# Altium footprint library MU_MP_39_V1.PcbLib: 76 footprints (part 4 of 5)
Each footprint in its own frame and in the unit in brackets; x right, y up, seen from the top. Pads: shape width x height; smd on the part's side, far side on the other; paste and mask are expansions set on the pad; w line width, h text height; cw(c..) or ccw(c..) is an arc to the next point about the centre after c.
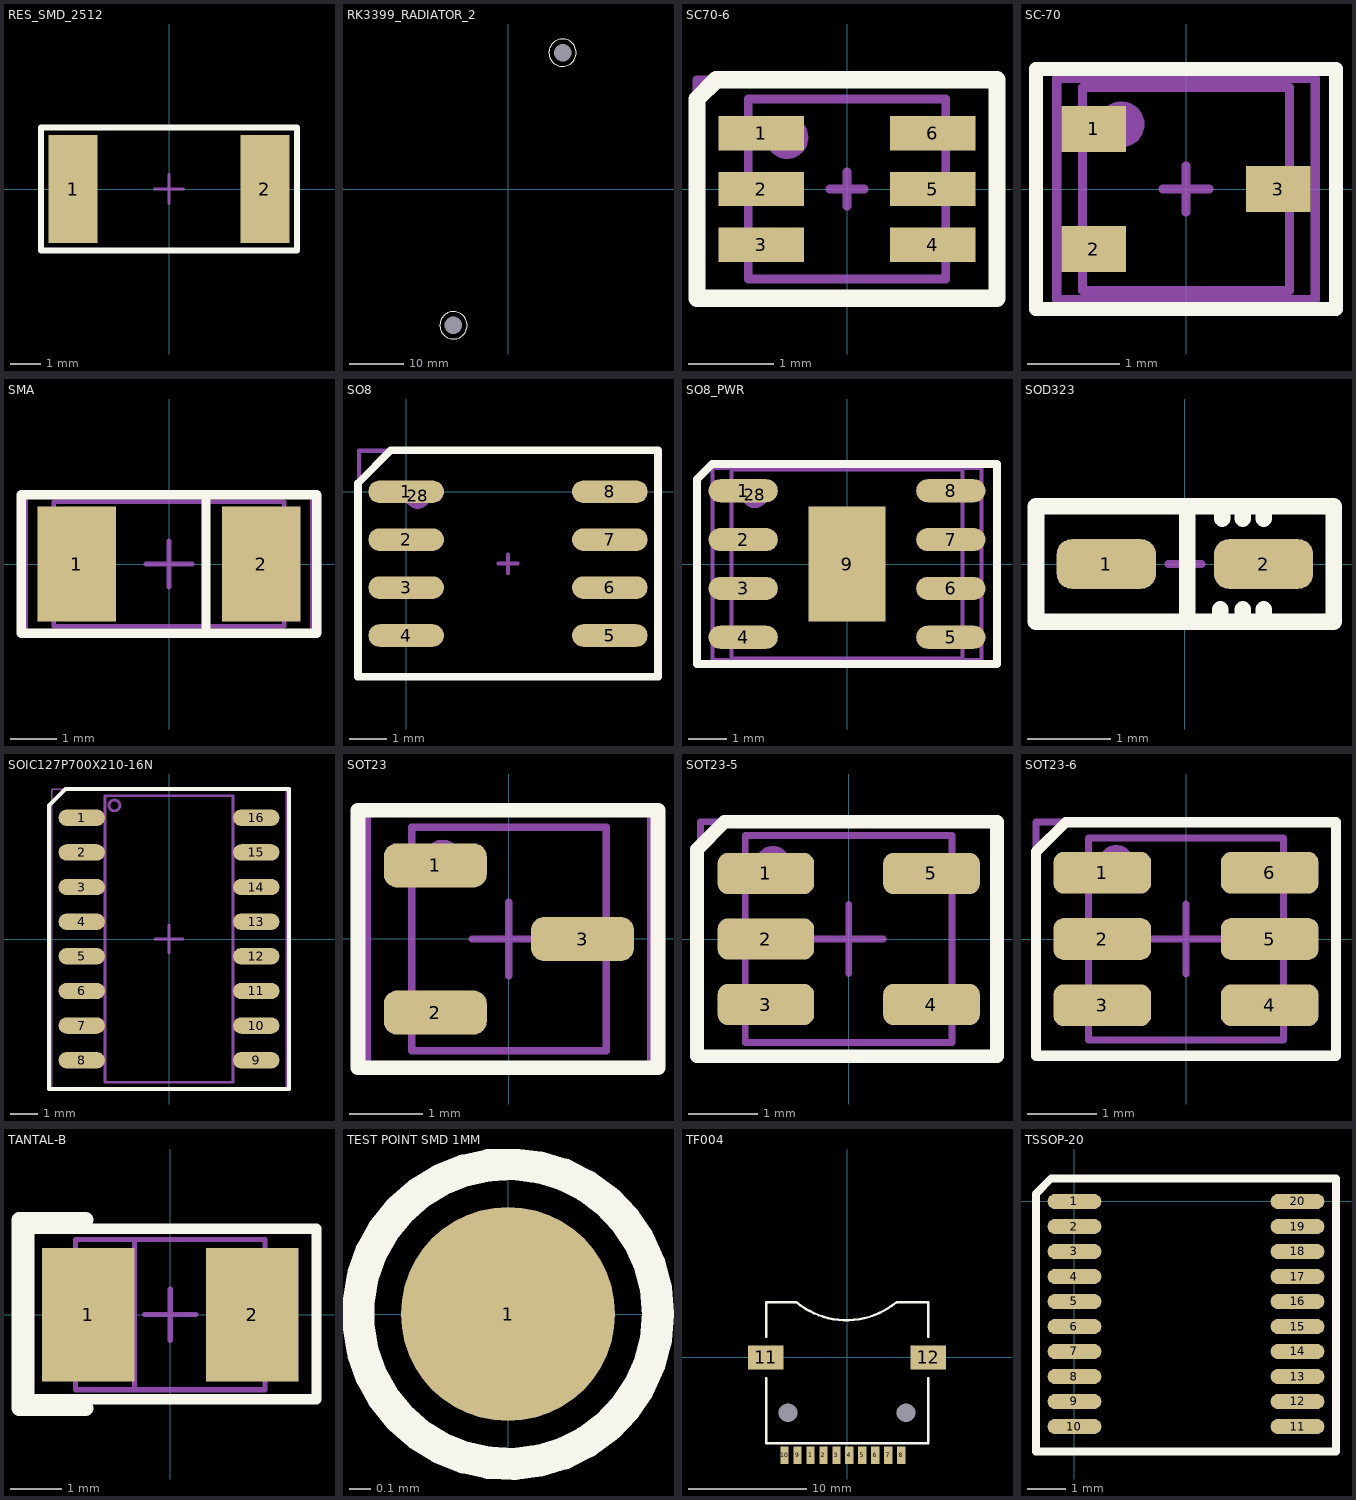
[diagram p3: the footprints below, top view; thin cyan lines are the x and y axes]

## RES_SMD_2512 [mm]
pads (2):
  rect 1.6x3.55 smd: 1(-3.15,0) 2(3.15,0)
Top Overlay:
  lines w0.2: -4.2,-2.025 -4.2,2.025 4.2,2.025 4.2,-2.025 -4.2,-2.025
Mechanical 1:
  lines w0.1: -4.2,-2.025 -4.2,2.025 4.2,2.025 4.2,-2.025 -4.2,-2.025
Mechanical 15:
  lines w0.1: -0.475,0 0.475,0 ; 0,-0.475 0,0.475 ; -4.2,-2.025 -4.2,2.025 4.2,2.025 4.2,-2.025 -4.2,-2.025
3D body "User Library-RESC6432X06.STEP": height 0.6, standoff 0, extent -3.2,-1.6 3.2,1.6

## RK3399_RADIATOR_2 [mm]
pads (2):
  round 0 hole 3.2 unplated mask+0.1: 2(10,25) 4(-10,-25)
Top Overlay:
  circle w0.15: c10,25 r2.5
  circle w0.15: c-10,-25 r2.5
Multi-Layer:
  pour cut-out: 8,25 8,24.803 8.077,24.417 8.228,24.053 8.446,23.725 8.725,23.446 9.053,23.228 9.417,23.077 9.803,23 10,23 10.197,23 10.583,23.077 10.947,23.228 11.275,23.446 11.553,23.725 11.772,24.053 11.923,24.417 12,24.803 12,25 12,25.197 11.923,25.583 11.772,25.947 11.553,26.275 11.275,26.554 10.947,26.772 10.583,26.923 10.197,27 10,27 9.803,27 9.417,26.923 9.053,26.772 8.725,26.554 8.446,26.275 8.228,25.947 8.077,25.583 8,25.197
  pour cut-out: -12,-25 -12,-25.197 -11.923,-25.583 -11.772,-25.947 -11.554,-26.275 -11.275,-26.554 -10.947,-26.772 -10.583,-26.923 -10.197,-27 -10,-27 -9.803,-27 -9.417,-26.923 -9.053,-26.772 -8.725,-26.554 -8.447,-26.275 -8.228,-25.947 -8.077,-25.583 -8,-25.197 -8,-25 -8,-24.803 -8.077,-24.417 -8.228,-24.053 -8.447,-23.725 -8.725,-23.447 -9.053,-23.228 -9.417,-23.077 -9.803,-23 -10,-23 -10.197,-23 -10.583,-23.077 -10.947,-23.228 -11.275,-23.447 -11.554,-23.725 -11.772,-24.053 -11.923,-24.417 -12,-24.803
3D body "МЮ.МАПР.02.01_Радиатор.STEP": height 8.7, standoff 2.2, extent -35.175,-27.025 34.825,26.975

## SC70-6 [mm]
pads (7):
  rect 1x0.4 smd: 1(-1,0.65) 2(-1,0) 3(-1,-0.65) 4(1,-0.65) 5(1,0) 6(1,0.65)
  round 0.5 on Mech1: ""(-0.7,0.6)
Top Overlay:
  lines w0.2: -1.75,-1.275 1.75,-1.275 1.75,1.275 -1.525,1.275 -1.75,1.05 -1.75,-1.275
Mechanical 1:
  lines w0.1: -1.15,-1.05 -1.15,1.05 1.15,1.05 1.15,-1.05 -1.15,-1.05
Mechanical 15:
  lines w0.1: -0.2,0 0.2,0 ; 0,-0.2 0,0.2 ; -1.75,-1.275 1.75,-1.275 1.75,1.275 -1.75,1.275 -1.75,-1.275
3D body "User Library-sot363.STEP": height 1, standoff 0, extent -1.15,-1.05 1.15,1.05

## SC-70 [mm]
pads (4):
  rect 0.7x0.5 smd: 1(-1,0.65) 2(-1,-0.65) 3(1,0)
  round 0.5 on Mech1: ""(-0.7,0.7)
Top Overlay:
  lines w0.15: -1.625,-1.3 1.625,-1.3 1.625,1.3 -1.625,1.3 -1.625,-1.3
Mechanical 1:
  lines w0.1: -1.123,-1.1 1.123,-1.1 1.123,1.1 -1.123,1.1 -1.123,-1.1
Mechanical 15:
  lines w0.1: -0.25,0 0.25,0 ; 0,-0.25 0,0.25 ; -1.4,-1.2 -1.4,1.2 1.4,1.2 1.4,-1.2 -1.4,-1.2
3D body "User Library-SOT323 (SC70-3)-1.STEP": height 1.1, standoff 0, extent -1.123,-1.1 1.123,1.1

## SMA [mm]
pads (3):
  rect 1.7x2.5 smd: 1(-2,0) 2(2,0)
  round 0.5 on Mech1: ""(2,0.9)
Top Overlay:
  lines w0.2: 0.8,-1.45 0.8,1.45 ; -3.2,-1.5 3.2,-1.5 3.2,1.5 -3.2,1.5 -3.2,-1.5
Mechanical 1:
  lines w0.1: -2.5,-1.35 2.5,-1.35 2.5,1.35 -2.5,1.35 -2.5,-1.35
Mechanical 15:
  lines w0.1: -0.5,0 0.5,0 ; 0,-0.5 0,0.5 ; -3.1,-1.5 -3.1,1.5 3.1,1.5 3.1,-1.5 -3.1,-1.5
3D body "User Library-Diode Molded BodyDIOM5025X231N.STEP": height 2.28, standoff -0.03, extent -2.5,-1.35 2.5,1.35

## SO8 [mm]
pads (9):
  rrect100% 2x0.6 smd: 1(0,0) 2(0,-1.27) 3(0,-2.54) 4(0,-3.81) 5(5.4,-3.81) 6(5.4,-2.54) 7(5.4,-1.27) 8(5.4,0)
  round 0.7 on Mech1: 28(0.305,-0.105)
Top Overlay:
  lines w0.2: -1.275,-4.905 6.675,-4.905 6.675,1.095 -0.405,1.095 -1.275,0.225 -1.275,-4.905
Mechanical 1:
  lines w0.1: -1.25,-4.93 -1.25,1.1 6.675,1.1 6.675,-4.93 -1.25,-4.93
Mechanical 15:
  lines w0.1: 2.45,-1.905 2.95,-1.905 ; 2.7,-2.155 2.7,-1.655 ; -1.25,-4.93 -1.25,1.07 6.675,1.07 6.675,-4.93 -1.25,-4.93
3D body "User Library-SOIC-8-1.STEP": height 1.75, standoff 0, extent -0.3,-4.35 5.7,0.55

## SO8_PWR [mm]
pads (10):
  rrect100% 1.8x0.6 smd: 1(-2.7,1.905) 2(-2.7,0.635) 3(-2.7,-0.635) 4(-2.7,-1.905) 5(2.7,-1.905) 6(2.7,-0.635) 7(2.7,0.635) 8(2.7,1.905)
  rect 2x3 smd: 9(0,0)
  round 0.7 on Mech1: 28(-2.395,1.8)
Top Overlay:
  lines w0.2: -3.9,-2.6 -3.9,2.2 -3.5,2.6 3.9,2.6 3.9,-2.6 -3.9,-2.6
Mechanical 1:
  lines w0.1: -3,-2.45 3,-2.45 3,2.45 -3,2.45 -3,-2.45
Mechanical 15:
  lines w0.1: -0.25,0 0.25,0 ; 0,-0.25 0,0.25 ; -3.5,-2.5 3.5,-2.5 3.5,2.5 -3.5,2.5 -3.5,-2.5
3D body "User Library-SOIC-8-1.STEP": height 1.75, standoff 0, extent -3,-2.45 3,2.45

## SOD323 [mm]
pads (2):
  rrect60% 1.2x0.6 smd: 1(-0.95,0) 2(0.95,0)
Top Overlay:
  lines w0.2: 0.025,-0.7 0.025,0.7 ; 0.425,-0.675 0.425,-0.55 ; 0.45,0.55 0.45,0.7 ; 0.7,-0.7 0.7,-0.55 ; 0.7,0.55 0.7,0.7 ; 0.95,-0.7 0.95,-0.55 ; 0.95,0.55 0.95,0.7 ; -1.8,-0.7 1.8,-0.7 1.8,0.7 -1.8,0.7 -1.8,-0.7
Mechanical 1:
  lines w0.1: 0.025,-0.625 0.025,0.55 ; -1.8,-0.7 -1.8,0.7 1.825,0.7 1.825,-0.7 -1.8,-0.7
Mechanical 15:
  lines w0.1: -0.2,0 0.2,0 ; 0,-0.2 0,0.2 ; -1.775,-0.7 1.775,-0.7 1.775,0.7 -1.775,0.7 -1.775,-0.7
3D body "User Library-1N4148WS.STEP": height 1.04, standoff -0.06, extent -1.15,-0.6 1.15,0.6

## SOIC127P700X210-16N [mm]
pads (16):
  oval 1.7x0.6 smd: 1(-3.2,4.445) 2(-3.2,3.175) 3(-3.2,1.905) 4(-3.2,0.635) 5(-3.2,-0.635) 6(-3.2,-1.905) 7(-3.2,-3.175) 8(-3.2,-4.445) 9(3.2,-4.445) 10(3.2,-3.175) 11(3.2,-1.905) 12(3.2,-0.635) 13(3.2,0.635) 14(3.2,1.905) 15(3.2,3.175) 16(3.2,4.445)
Top Overlay:
  lines w0.15: -4.4,-5.5 -4.4,4.9 -3.8,5.5 4.4,5.5 4.4,-5.5 -4.4,-5.5
Mechanical 13:
  circle w0.1: c-2,4.9 r0.2
  lines w0.1: -2.35,-5.25 -2.35,5.25 2.35,5.25 2.35,-5.25 -2.35,-5.25
  text ".Designator" at 0.5,-3 h0.7
Mechanical 15:
  lines w0.05: -4.3,-5.5 -4.3,5.5 4.3,5.5 4.3,-5.5 -4.3,-5.5
  lines w0.1: -0.5,0 0.5,0 ; 0,-0.5 0,0.5
3D body "SOIC127P700X210-16N.step": height 2.1, standoff 0, extent -3.5,-5.25 3.5,5.25

## SOT23 [mm]
pads (4):
  rrect60% 1.4x0.6 smd: 1(-1,1) 2(-1,-1) 3(1,0)
  round 0.5 on Mech1: ""(-0.9,1.1)
Top Overlay:
  lines w0.2: -2.05,-1.75 2.025,-1.75 2.025,1.75 -2.05,1.75 -2.05,-1.75
Mechanical 1:
  lines w0.1: -1.32,-1.52 1.32,-1.52 1.32,1.52 -1.32,1.52 -1.32,-1.52
Mechanical 15:
  lines w0.1: -0.5,0 0.5,0 ; 0,-0.5 0,0.5 ; -1.925,-1.75 -1.925,1.75 1.925,1.75 1.925,-1.75 -1.925,-1.75
3D body "SOT95P237X112-3N.step": height 1.12, standoff 0, extent -1.32,-1.52 1.32,1.52

## SOT23-5 [mm]
pads (6):
  rrect50% 1.4x0.6 smd: 1(-1.2,0.95) 2(-1.2,0) 3(-1.2,-0.95) 4(1.2,-0.95) 5(1.2,0.95)
  round 0.5 on Mech1: ""(-1.1,1.1)
Top Overlay:
  lines w0.2: -2.2,-1.7 2.15,-1.7 2.15,1.7 -1.8,1.7 -2.2,1.3 -2.2,-1.7
Mechanical 1:
  lines w0.1: -1.5,-1.5 -1.5,1.5 1.5,1.5 1.5,-1.5 -1.5,-1.5
Mechanical 15:
  lines w0.1: -0.5,0 0.5,0 ; 0,-0.5 0,0.5 ; -2.15,-1.7 -2.15,1.7 2.15,1.7 2.15,-1.7 -2.15,-1.7
3D body "SOT23-5-1.step": height 1.3, standoff 0, extent -1.5,-1.5 1.5,1.5

## SOT23-6 [mm]
pads (7):
  rrect50% 1.4x0.6 smd: 1(-1.2,0.95) 2(-1.2,0) 3(-1.2,-0.95) 4(1.2,-0.95) 5(1.2,0) 6(1.2,0.95)
  round 0.5 on Mech1: ""(-1,1.1)
Top Overlay:
  lines w0.15: -2.15,-1.675 -2.15,1.25 -1.725,1.675 2.15,1.675 2.15,-1.675 -2.15,-1.675
Mechanical 1:
  lines w0.1: -1.4,-1.45 1.4,-1.45 1.4,1.45 -1.4,1.45 -1.4,-1.45
Mechanical 15:
  lines w0.1: -0.5,0 0.5,0 ; 0,-0.5 0,0.5 ; -2.15,-1.675 2.15,-1.675 2.15,1.675 -2.15,1.675 -2.15,-1.675
3D body "User Library-SOT23-6-2.STEP": height 1.45, standoff 0, extent -1.4,-1.45 1.4,1.45

## TANTAL-B [mm]
pads (2):
  rect 1.8x2.6 smd: 1(-1.6,0) 2(1.6,0)
Top Overlay:
  lines w0.2: -2.75,-1.65 2.85,-1.65 2.85,1.675 -2.75,1.675 -2.75,-1.65
  lines w0.3: -1.65,-1.825 -2.95,-1.825 -2.95,1.85 -1.65,1.85
Mechanical 1:
  lines w0.1: -0.7,-1.465 -0.7,1.465 ; -1.85,-1.465 1.85,-1.465 1.85,1.465 -1.85,1.465 -1.85,-1.465
Mechanical 15:
  lines w0.1: -0.5,0 0.5,0 ; 0,-0.5 0,0.5 ; -2.725,-1.65 -2.725,1.65 2.85,1.65 2.85,-1.65 -2.725,-1.65
3D body "User Library-AVX_BCASE.STEP": height 2.03, standoff 0, extent -1.85,-1.465 1.85,1.465

## TEST POINT SMD 1MM [mm]
pads (1):
  round 1 smd: 1(0,0)
Top Overlay:
  circle w0.15: c0,0 r0.7

## TF004 [mm]
pads (14):
  rect 0.7x1.5 smd: 1(-3.1,-8.3) 2(-2,-8.3) 3(-0.9,-8.3) 4(0.2,-8.3) 5(1.3,-8.3) 6(2.4,-8.3) 7(3.5,-8.3) 8(4.6,-8.3) 9(-4.2,-8.3) 10(-5.3,-8.3)
  rect 3x2 smd: 11(-6.9,0) 12(6.9,0)
  round 0 hole 1.6 unplated: 13(5,-4.7) 14(-5,-4.7)
Top Overlay:
  lines w0.2: -6.85,-1.75 -6.85,-7.3 6.9,-7.3 6.9,-1.75 ; -6.85,1.75 -6.85,4.7 -4.3,4.7 ccw(c-0.05,9.8) 4.17,4.675 ; 4.2,4.7 6.9,4.7 6.9,1.75
Multi-Layer:
  pour cut-out: 3.8,-4.7 3.8,-4.818 3.846,-5.05 3.937,-5.268 4.068,-5.465 4.235,-5.632 4.432,-5.763 4.65,-5.854 4.882,-5.9 5,-5.9 5.118,-5.9 5.35,-5.854 5.568,-5.763 5.765,-5.632 5.932,-5.465 6.063,-5.268 6.154,-5.05 6.2,-4.818 6.2,-4.7 6.2,-4.582 6.154,-4.35 6.063,-4.132 5.932,-3.935 5.765,-3.768 5.568,-3.637 5.35,-3.546 5.118,-3.5 5,-3.5 4.882,-3.5 4.65,-3.546 4.432,-3.637 4.235,-3.768 4.068,-3.935 3.937,-4.132 3.846,-4.35 3.8,-4.582
  pour cut-out: -5,-5.9 -5.118,-5.9 -5.35,-5.854 -5.568,-5.763 -5.765,-5.632 -5.932,-5.465 -6.063,-5.268 -6.154,-5.05 -6.2,-4.818 -6.2,-4.7 -6.2,-4.582 -6.154,-4.35 -6.063,-4.132 -5.932,-3.935 -5.765,-3.768 -5.568,-3.637 -5.35,-3.546 -5.118,-3.5 -5,-3.5 -4.882,-3.5 -4.65,-3.546 -4.432,-3.637 -4.235,-3.768 -4.068,-3.935 -3.937,-4.132 -3.846,-4.35 -3.8,-4.582 -3.8,-4.7 -3.8,-4.818 -3.846,-5.05 -3.937,-5.268 -4.068,-5.465 -4.235,-5.632 -4.432,-5.763 -4.65,-5.854 -4.882,-5.9
3D body: height 1.8, standoff 0, extent -6.85,-7.25 6.9,4.9

## TSSOP-20 [mm]
pads (20):
  oval 1.4x0.4 smd: 1(0,0) 2(0,-0.65) 3(0,-1.3) 4(0,-1.95) 5(0,-2.6) 6(0,-3.25) 7(0,-3.9) 8(0,-4.55) 9(0,-5.2) 10(0,-5.85) 11(5.8,-5.85) 12(5.8,-5.2) 13(5.8,-4.55) 14(5.8,-3.9) 15(5.8,-3.25) 16(5.8,-2.6) 17(5.8,-1.95) 18(5.8,-1.3) 19(5.8,-0.65) 20(5.8,0)
Top Overlay:
  lines w0.2: -1,-6.5 6.8,-6.5 6.8,0.6 -0.6,0.6 -1,0.2 -1,-6.5
Top Solder:
  rectangle: -0.8,-5.85 0.8,-0.025
  rectangle: 5,-5.85 6.6,0
Mechanical 15:
  lines w0.1: -1,-6.5 -1,0.15 -0.55,0.6 6.8,0.6 6.8,-6.5 -1,-6.5
3D body "User Library-tssop-20-1.STEP": height 1.19, standoff -0.01, extent -0.425,-6.225 6.175,0.375